# Altium footprint library Intelliclone.PcbLib: 372 footprints (part 8 of 24)
Each footprint in its own frame and in the unit in brackets; x right, y up, seen from the top. Pads: shape width x height; smd on the part's side, far side on the other; paste and mask are expansions set on the pad; w line width, h text height; cw(c..) or ccw(c..) is an arc to the next point about the centre after c.
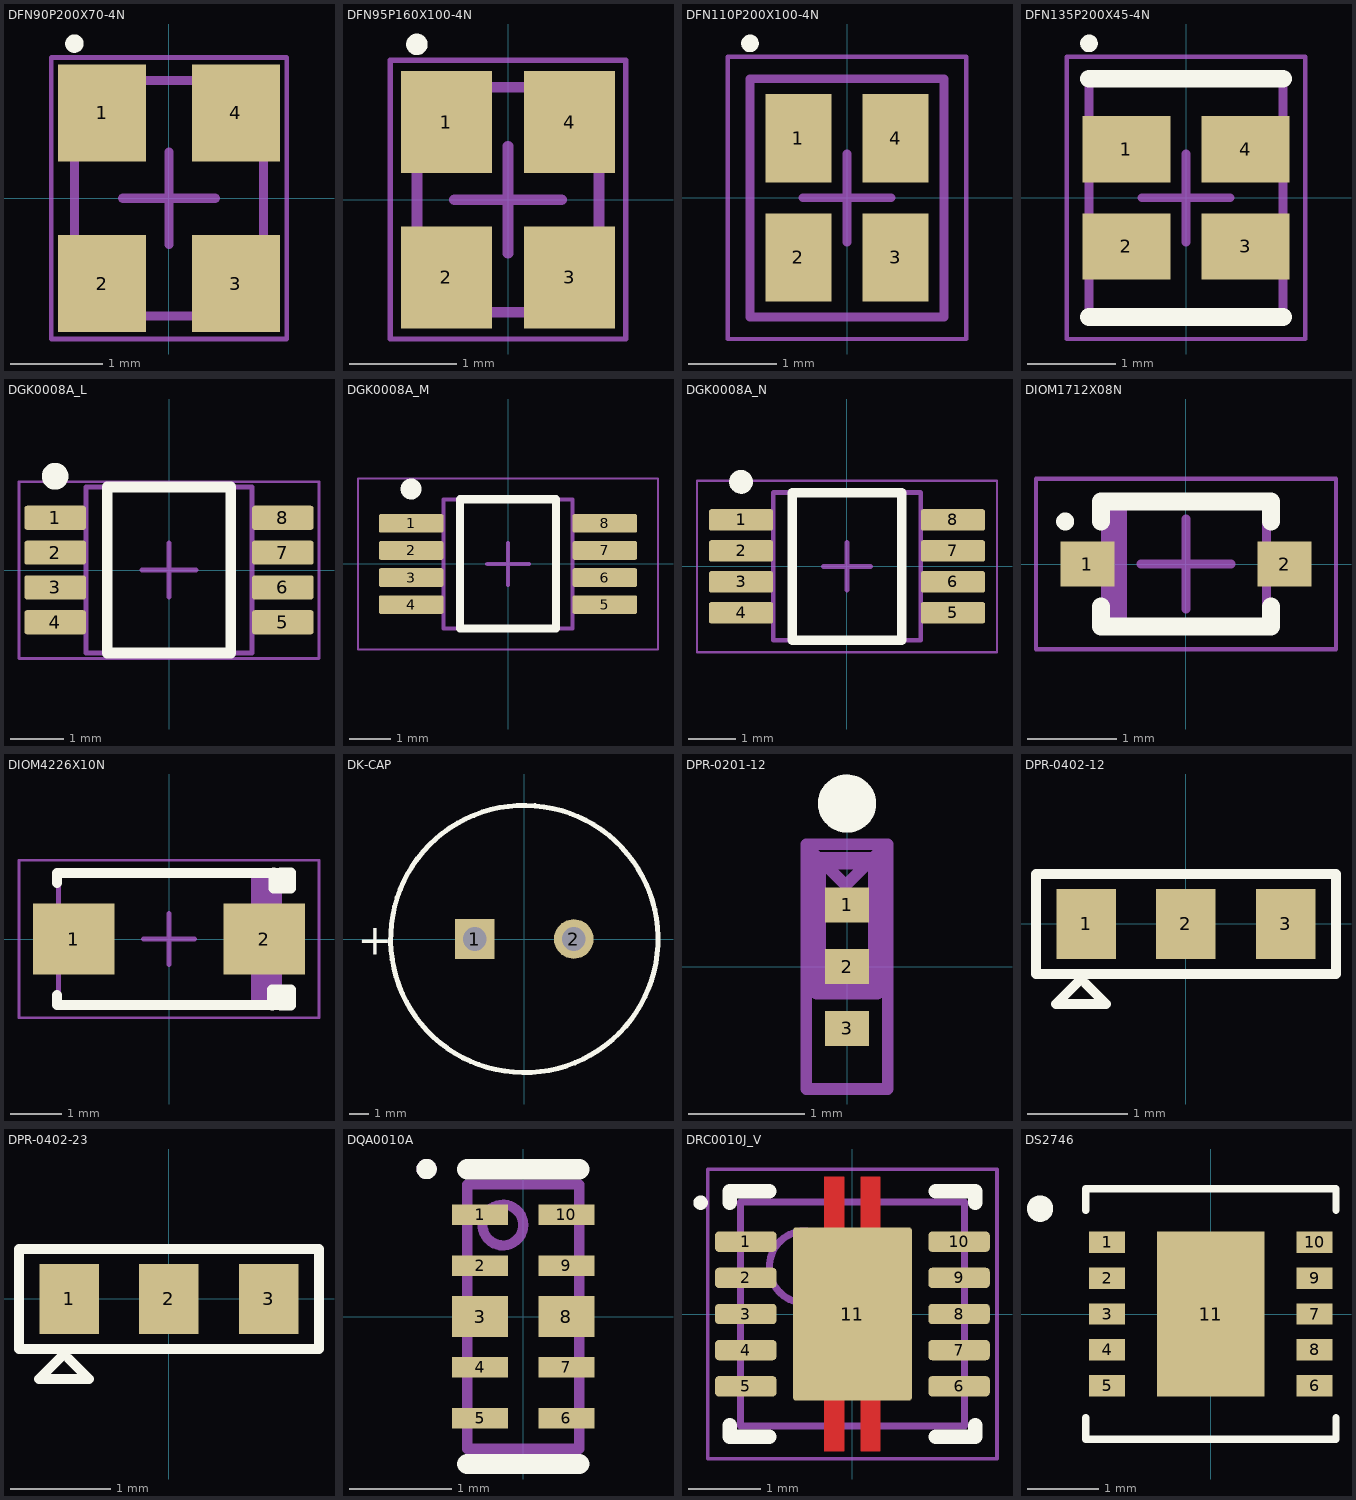
[diagram p7: the footprints below, top view; thin cyan lines are the x and y axes]

## DFN90P200X70-4N [mm] "DFN, 4-Leads, Body 2.50x2.00mm, Pitch 0.90mm, IPC Medium Density"
height 0.7
pads (4):
  rect 0.95x1.05 smd: 1(-0.725,0.925) 2(-0.725,-0.925) 3(0.725,-0.925) 4(0.725,0.925)
Top Overlay:
  circle w0.1: c-1.025,1.675 r0.05
Mechanical 13:
  lines w0.1: -1.025,-1.275 -1.025,1.275 1.025,1.275 1.025,-1.275 -1.025,-1.275
Mechanical 15:
  lines w0.05: -1.275,-1.525 -1.275,1.525 1.275,1.525 1.275,-1.525 -1.275,-1.525
  lines w0.1: -0.5,0 0.5,0 ; 0,-0.5 0,0.5
3D body: height 0.7, standoff 0.05, extent -1.025,-1.275 1.025,1.275

## DFN95P160X100-4N [mm] "DFN, 4-Leads, Body 2.00x1.60mm, Pitch 0.95mm, IPC Medium Density"
height 1
pads (4):
  rect 0.85x0.95 smd: 1(-0.575,0.725) 2(-0.575,-0.725) 3(0.575,-0.725) 4(0.575,0.725)
Top Overlay:
  circle w0.1: c-0.85,1.45 r0.05
Mechanical 13:
  lines w0.1: -0.85,-1.05 -0.85,1.05 0.85,1.05 0.85,-1.05 -0.85,-1.05
Mechanical 15:
  lines w0.05: -1.1,-1.3 -1.1,1.3 1.1,1.3 1.1,-1.3 -1.1,-1.3
  lines w0.1: -0.5,0 0.5,0 ; 0,-0.5 0,0.5
3D body: height 1, standoff 0, extent -0.85,-1.05 0.85,1.05

## DFN110P200X100-4N [mm] "DFN, 4-Leads, Body 2.50x2.00mm, Pitch 1.10mm, IPC Medium Density"
height 1
pads (4):
  rect 0.75x1 smd: 1(-0.55,0.675) 2(-0.55,-0.675) 3(0.55,-0.675) 4(0.55,0.675)
Top Overlay:
  circle w0.1: c-1.1,1.75 r0.05
Mechanical 13:
  lines w0.1: -1.1,-1.35 1.1,-1.35 1.1,1.35 -1.1,1.35 -1.1,-1.35
Mechanical 15:
  lines w0.05: -1.35,-1.6 1.35,-1.6 1.35,1.6 -1.35,1.6 -1.35,-1.6
  lines w0.1: -0.5,0 0.5,0 ; 0,-0.5 0,0.5
3D body: height 1, standoff 0, extent -1.1,-1.35 1.1,1.35

## DFN135P200X45-4N [mm] "DFN, 4-Leads, Body 2.50x2.00mm, Pitch 1.35mm, IPC Medium Density"
height 0.45
pads (4):
  rect 1x0.75 smd: 1(-0.675,0.55) 2(-0.675,-0.55) 3(0.675,-0.55) 4(0.675,0.55)
Top Overlay:
  circle w0.1: c-1.1,1.75 r0.05
  lines w0.2: -1.1,-1.35 1.1,-1.35 ; -1.1,1.35 1.1,1.35
Mechanical 13:
  lines w0.1: -1.1,-1.35 -1.1,1.35 1.1,1.35 1.1,-1.35 -1.1,-1.35
Mechanical 15:
  lines w0.05: -1.35,-1.6 -1.35,1.6 1.35,1.6 1.35,-1.6 -1.35,-1.6
  lines w0.1: -0.5,0 0.5,0 ; 0,-0.5 0,0.5
3D body: height 0.45, standoff 0, extent -1.1,-1.35 1.1,1.35

## DGK0008A_L [mm] "TSOP, 8-Leads, Body 3.1x3.1mm, Pitch 0.65mm, IPC High Density"
height 1.1
pads (8):
  rrect22% 1.15x0.45 smd: 1(-2.125,0.975) 2(-2.125,0.325) 3(-2.125,-0.325) 4(-2.125,-0.975) 5(2.125,-0.975) 6(2.125,-0.325) 7(2.125,0.325) 8(2.125,0.975)
Top Overlay:
  circle w0.25: c-2.125,1.75 r0.125
  lines w0.2: -1.15,-1.55 -1.15,1.55 1.15,1.55 1.15,-1.55 -1.15,-1.55
Mechanical 13:
  lines w0.1: -1.55,-1.55 -1.55,1.55 1.55,1.55 1.55,-1.55 -1.55,-1.55
Mechanical 15:
  lines w0.05: -2.8,-1.65 -2.8,1.65 2.8,1.65 2.8,-1.65 -2.8,-1.65
  lines w0.1: -0.5,0 0.5,0 ; 0,-0.5 0,0.5
3D body "MUY08A_ASM.stp": height 0.94, standoff -0.02, extent -2.451,-1.499 2.451,1.499

## DGK0008A_M [mm] "TSOP, 8-Leads, Body 3.1x3.1mm, Pitch 0.65mm, IPC Low Density"
height 1.1
pads (8):
  rrect22% 1.55x0.45 smd: 1(-2.325,0.975) 2(-2.325,0.325) 3(-2.325,-0.325) 4(-2.325,-0.975) 5(2.325,-0.975) 6(2.325,-0.325) 7(2.325,0.325) 8(2.325,0.975)
Top Overlay:
  circle w0.25: c-2.325,1.8 r0.125
  lines w0.2: -1.15,-1.55 1.15,-1.55 1.15,1.55 -1.15,1.55 -1.15,-1.55
Mechanical 13:
  lines w0.1: -1.55,-1.55 1.55,-1.55 1.55,1.55 -1.55,1.55 -1.55,-1.55
Mechanical 15:
  lines w0.05: -3.6,-2.05 3.6,-2.05 3.6,2.05 -3.6,2.05 -3.6,-2.05
  lines w0.1: -0.5,0 0.5,0 ; 0,-0.5 0,0.5
3D body "MUY08A_ASM.stp": height 0.94, standoff -0.02, extent -2.451,-1.499 2.451,1.499

## DGK0008A_N [mm] "TSOP, 8-Leads, Body 3.1x3.1mm, Pitch 0.65mm, IPC Medium Density"
height 1.1
pads (8):
  rrect22% 1.35x0.45 smd: 1(-2.225,0.975) 2(-2.225,0.325) 3(-2.225,-0.325) 4(-2.225,-0.975) 5(2.225,-0.975) 6(2.225,-0.325) 7(2.225,0.325) 8(2.225,0.975)
Top Overlay:
  circle w0.25: c-2.225,1.775 r0.125
  lines w0.2: -1.15,-1.55 1.15,-1.55 1.15,1.55 -1.15,1.55 -1.15,-1.55
Mechanical 13:
  lines w0.1: -1.55,-1.55 1.55,-1.55 1.55,1.55 -1.55,1.55 -1.55,-1.55
Mechanical 15:
  lines w0.05: -3.15,-1.8 3.15,-1.8 3.15,1.8 -3.15,1.8 -3.15,-1.8
  lines w0.1: -0.5,0 0.5,0 ; 0,-0.5 0,0.5
3D body "MUY08A_ASM.stp": height 0.94, standoff -0.02, extent -2.451,-1.499 2.451,1.499

## DIOM1712X08N [mm] "Molded Diode, 2-Leads, Body 1.70x1.25mm, IPC Medium Density"
height 0.8
pads (2):
  rect 0.6x0.5 smd: 1(-1.1,0) 2(1.1,0)
Top Overlay:
  circle w0.1: c-1.35,0.475 r0.05
  lines w0.2: -0.95,-0.475 -0.95,-0.7 0.95,-0.7 0.95,-0.475 ; -0.95,0.475 -0.95,0.7 0.95,0.7 0.95,0.475
Mechanical 13:
  rectangle: -0.9,-0.675 -0.658,0.675
  lines w0.1: -0.9,-0.675 0.9,-0.675 0.9,0.675 -0.9,0.675 -0.9,-0.675
Mechanical 15:
  lines w0.05: -1.675,-0.95 1.675,-0.95 1.675,0.95 -1.675,0.95 -1.675,-0.95
  lines w0.1: -0.5,0 0.5,0 ; 0,-0.5 0,0.5
3D body: height 0.8, standoff 0, extent -0.9,-0.675 0.9,0.675

## DIOM4226X10N [mm] "Molded Diode, 2-Leads, Body 4.25x2.60mm, IPC Medium Density"
height 1
pads (2):
  rect 1.6x1.4 smd: 1(-1.875,0) 2(1.875,0)
Top Overlay:
  lines w0.2: -2.2,-1.1 -2.2,-1.3 2.2,-1.3 2.2,-1 ; -2.2,1.1 -2.2,1.3 2.2,1.3 2.2,1 ; 2.4,-1.3 2.4,-1 ; 2.4,1 2.4,1.3
  lines w0.203: 2.032,-1.3 2.032,-1 2.4,-1 ; 2.057,1.3 2.057,1 2.4,1 2.4,1.3 2.2,1.3 ; 2.2,-1.3 2.4,-1.3 2.4,-1.2
Mechanical 13:
  rectangle: 1.615,-1.3 2.2,1.3
  lines w0.1: -2.175,-1.3 2.175,-1.3 2.175,1.3 -2.175,1.3 -2.175,-1.3
Mechanical 15:
  lines w0.05: -2.95,-1.55 2.95,-1.55 2.95,1.55 -2.95,1.55 -2.95,-1.55
  lines w0.1: -0.5,0 0.5,0 ; 0,-0.5 0,0.5
3D body "DIOM4226X10N.step": height 1, standoff 0, extent -2.395,-1.3 2.395,1.3

## DK-CAP [mm] "Elna DK Supercap"
height 0.241
pads (2):
  rect 2x2 hole 1.2: 1(-2.5,0)
  round 2 hole 1.2: 2(2.5,0)
Top Overlay:
  lines w0.254: 6.749,0.135 cw(c0,0) 6.749,0.138
  text "+" at -8.4,-0.8 h1.52
3D body: height 9.5, standoff 0, extent -6.697,-6.737 6.75,6.737

## DPR-0201-12 [mm]
pads (3):
  rect 0.38x0.3 smd: 1(0,0.53) 2(0,0) 3(0,-0.53)
Top Overlay:
  circle w0.25: c0,1.4 r0.125
Mechanical 15:
  lines w0.1: -0.34,1.026 -0.011,0.697 0.329,1.037 ; -0.35,-1.05 -0.35,1.05 0.35,1.05 0.35,-1.05 -0.35,-1.05
Mechanical 17:
  lines w0.15: -0.254,-0.209 -0.254,0.909 0.254,0.909 0.254,-0.209 -0.254,-0.209
3D body "RES0201.stp": height 0.3, standoff 0, extent -0.155,-0.02 0.145,0.58

## DPR-0402-12 [mm] "Dual Position 0402 Resistor, Default 1-2"
height 5.33
pads (3):
  rect 0.599x0.7 smd: 1(-0.997,0) 2(-0.003,0) 3(0.997,0)
Top Overlay:
  lines w0.1: -1,-0.6 -0.8,-0.8 -1.3,-0.8 -1,-0.5 ; -1.5,-0.5 1.5,-0.5 1.5,0.5 -1.5,0.5 -1.5,-0.5
3D body "RES0402.stp": height 0.3, standoff 0, extent -1.013,-0.25 -0.013,0.25

## DPR-0402-23 [mm] "Dual Position 0402 Resistor, Default 2-3"
height 5.33
pads (3):
  rect 0.599x0.7 smd: 1(-0.997,0) 2(-0.003,0) 3(0.997,0)
Top Overlay:
  lines w0.1: -1,-0.6 -0.8,-0.8 -1.3,-0.8 -1,-0.5 ; -1.5,-0.5 -1.5,0.5 1.5,0.5 1.5,-0.5 -1.5,-0.5
3D body "RES0402.stp": height 0.3, standoff 0, extent 0,-0.25 1,0.25

## DQA0010A [mm] "SON, 10-Leads, Body 1x2.5mm, Pitch 0.5mm, TI Recommended"
height 0.55
pads (10):
  rect 0.55x0.2 smd: 1(-0.425,1) 2(-0.425,0.5) 4(-0.425,-0.5) 5(-0.425,-1) 6(0.425,-1) 7(0.425,-0.5) 9(0.425,0.5) 10(0.425,1)
  rect 0.55x0.4 smd: 3(-0.425,0) 8(0.425,0)
Top Overlay:
  circle w0.1: c-0.95,1.45 r0.05
  lines w0.2: -0.55,-1.45 0.55,-1.45 ; -0.55,1.45 0.55,1.45
Mechanical 5:
  circle w0.1: c-0.2,0.9 r0.2
  circle w0.1: c-0.95,1.45 r0.05
  lines w0.1: -0.55,-1.3 0.55,-1.3 0.55,1.3 -0.55,1.3 -0.55,-1.3
  text ".Designator" at -0.225,0.3 h0.38
3D body: height 0.55, standoff 0, extent -0.55,-1.3 0.55,1.3
3D body: height 0.56, standoff 0.3, extent -0.399,0.701 -0.001,1.099

## DRC0010J_V [mm] "SON, 10-Leads, Body 3x3mm, Pitch 0.5mm, Thermal Pad 2.4x1.65mm, TI Recommended"
height 1
pads (11):
  rrect36% 0.85x0.28 smd paste-0.025 mask+0.07: 1(-1.475,1) 2(-1.475,0.5) 3(-1.475,0) 4(-1.475,-0.5) 5(-1.475,-1) 6(1.475,-1) 7(1.475,-0.5) 8(1.475,0) 9(1.475,0.5) 10(1.475,1)
  rrect6% 1.65x2.4 smd paste-0.825 mask+0.07: 11(0,0)
Top Layer:
  rectangle: -0.39,-1.9 -0.11,-1.143
  region: 0.39,-1.143 0.11,-1.143 0.11,-1.9 0.39,-1.9
  region: 0.39,1.9 0.11,1.9 0.11,1.143 0.39,1.143
  rectangle: -0.39,1.143 -0.11,1.9
Top Overlay:
  circle w0.1: c-2.1,1.54 r0.05
  lines w0.2: -1.7,-1.54 -1.7,-1.7 -1.15,-1.7 ; -1.7,1.54 -1.7,1.7 -1.15,1.7 ; 1.15,-1.7 1.7,-1.7 1.7,-1.54 ; 1.15,1.7 1.7,1.7 1.7,1.54
Top Paste:
  rectangle: -0.79,-1.16 -0.11,-0.11
  region: 0.79,-0.11 0.11,-0.11 0.11,-1.16 0.79,-1.16
  region: 0.79,1.16 0.11,1.16 0.11,0.11 0.79,0.11
  rectangle: -0.38,-1.88 -0.12,-1.38
  region: 0.38,-1.38 0.12,-1.38 0.12,-1.88 0.38,-1.88
  region: 0.38,1.88 0.12,1.88 0.12,1.38 0.38,1.38
  rectangle: -0.38,1.38 -0.12,1.88
  rectangle: -0.79,0.11 -0.11,1.16
Mechanical 13:
  circle w0.1: c-0.65,0.65 r0.5
  lines w0.1: -1.55,-1.55 1.55,-1.55 1.55,1.55 -1.55,1.55 -1.55,-1.55
Mechanical 15:
  lines w0.05: -2,-2 2,-2 2,2 -2,2 -2,-2
3D body: height 1, standoff 0, extent -1.55,-1.55 1.55,1.55

## DS2746 [mm]
pads (11):
  rect 0.5x0.3 smd: 1(-1.45,1) 2(-1.45,0.5) 3(-1.45,0) 4(-1.45,-0.5) 5(-1.45,-1) 6(1.45,-1) 7(1.45,0) 8(1.45,-0.5) 9(1.45,0.5) 10(1.45,1)
  rect 1.5x2.3 smd: 11(0,0)
Top Overlay:
  circle w0.254: c-2.388,1.473 r0.057
  lines w0.102: -1.75,-1.45 -1.75,-1.75 1.75,-1.75 1.75,-1.45 ; -1.75,1.45 -1.75,1.75 1.75,1.75 1.75,1.45
3D body: height 0.8, standoff 0.05, extent -1.753,-1.753 1.753,1.753